# Altium footprint library WR-TBL_Pluggable PCB Header.PcbLib: 719 footprints (part 40 of 45)
Each footprint in its own frame and in the unit in brackets; x right, y up, seen from the top. Pads: shape width x height; smd on the part's side, far side on the other; paste and mask are expansions set on the pad; w line width, h text height; cw(c..) or ccw(c..) is an arc to the next point about the centre after c.
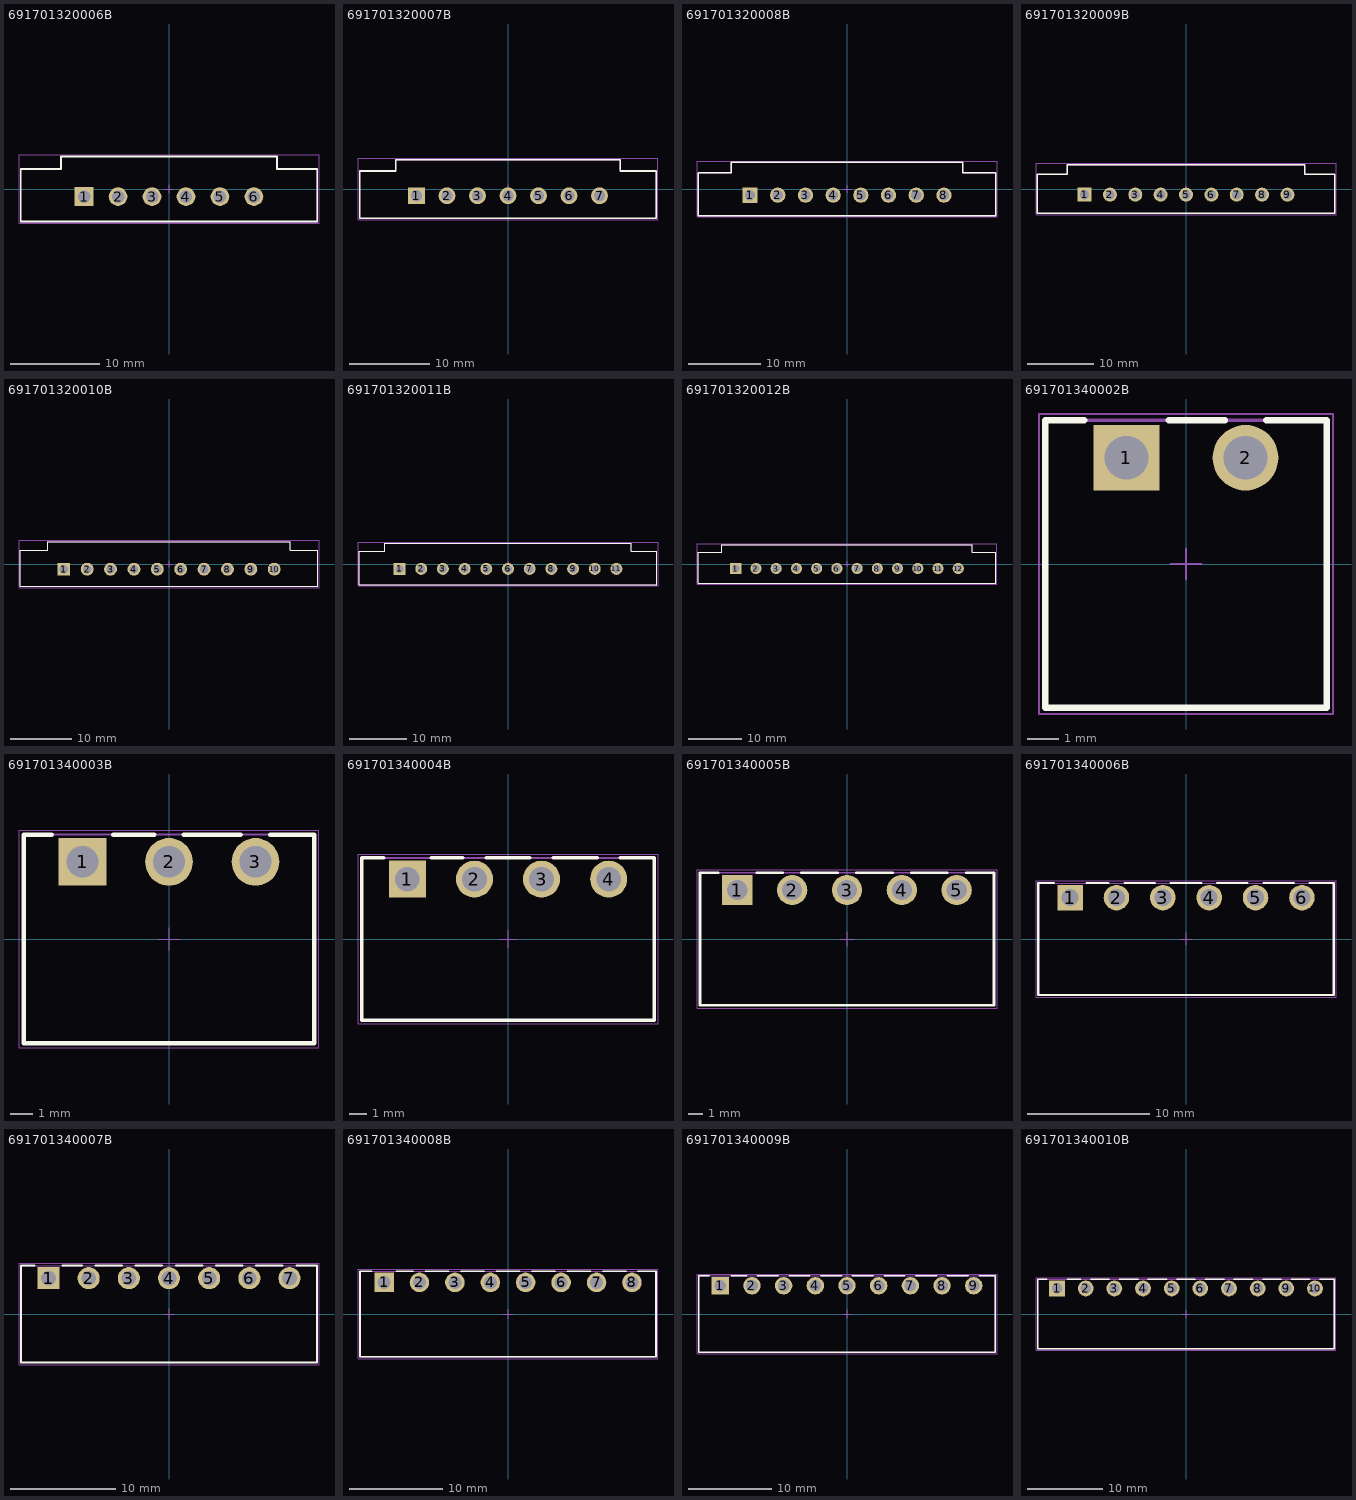
[diagram p39: the footprints below, top view; thin cyan lines are the x and y axes]

## 691701320006B [mm] "THR - 3,81mm - PCB Vertical Flange - 06p"
height 9.2
pads (6):
  rect 2.1x2.1 hole 1.4: 1(-9.525,-0.85)
  round 2.1 hole 1.4: 2(-5.715,-0.85) 3(-1.905,-0.85) 4(1.905,-0.85) 5(5.715,-0.85) 6(9.525,-0.85)
Top Overlay:
  lines w0.2: -16.625,-3.65 -16.625,2.25 -12.12,2.25 -12.12,3.65 12.12,3.65 12.12,2.25 16.625,2.25 16.625,-3.65 -16.625,-3.65
Mechanical 13:
  lines w0.1: -16.625,-3.65 16.625,-3.65 16.625,2.25 12.12,2.25 12.12,3.65 -12.12,3.65 -12.12,2.25 -16.625,2.25 -16.625,-3.65
Mechanical 15:
  lines w0.05: -0.5,0 0.5,0 ; 0,-0.5 0,0.5 ; -16.825,-3.85 -16.825,3.85 16.825,3.85 16.825,-3.85 -16.825,-3.85
3D body "691701320006B.stp": height 9.25, standoff -2.55, extent -16.625,-3.65 16.625,3.65

## 691701320007B [mm] "THR - 3,81mm - PCB Vertical Flange - 07p"
height 9.2
pads (7):
  rect 2.1x2.1 hole 1.4: 1(-11.43,-0.85)
  round 2.1 hole 1.4: 2(-7.62,-0.85) 3(-3.81,-0.85) 4(0,-0.85) 5(3.81,-0.85) 6(7.62,-0.85) 7(11.43,-0.85)
Top Overlay:
  lines w0.2: -18.53,-3.65 -18.53,2.25 -14.025,2.25 -14.025,3.65 14.025,3.65 14.025,2.25 18.53,2.25 18.53,-3.65 -18.53,-3.65
Mechanical 13:
  lines w0.1: -18.53,-3.65 18.53,-3.65 18.53,2.25 14.025,2.25 14.025,3.65 -14.025,3.65 -14.025,2.25 -18.53,2.25 -18.53,-3.65
Mechanical 15:
  lines w0.05: -0.5,0 0.5,0 ; 0,-0.5 0,0.5 ; -18.73,-3.85 -18.73,3.85 18.73,3.85 18.73,-3.85 -18.73,-3.85
3D body "691701320007B.stp": height 9.25, standoff -2.55, extent -18.53,-3.65 18.53,3.65

## 691701320008B [mm] "THR - 3,81mm - PCB Vertical Flange - 08p"
height 9.2
pads (8):
  rect 2.1x2.1 hole 1.4: 1(-13.335,-0.85)
  round 2.1 hole 1.4: 2(-9.525,-0.85) 3(-5.715,-0.85) 4(-1.905,-0.85) 5(1.905,-0.85) 6(5.715,-0.85) 7(9.525,-0.85) 8(13.335,-0.85)
Top Overlay:
  lines w0.2: -20.435,-3.65 -20.435,2.25 -15.93,2.25 -15.93,3.65 15.93,3.65 15.93,2.25 20.435,2.25 20.435,-3.65 -20.435,-3.65
Mechanical 13:
  lines w0.1: -20.435,-3.65 20.435,-3.65 20.435,2.25 15.93,2.25 15.93,3.65 -15.93,3.65 -15.93,2.25 -20.435,2.25 -20.435,-3.65
Mechanical 15:
  lines w0.05: -0.5,0 0.5,0 ; 0,-0.5 0,0.5 ; -20.635,-3.85 -20.635,3.85 20.635,3.85 20.635,-3.85 -20.635,-3.85
3D body "691701320008B.stp": height 9.25, standoff -2.55, extent -20.435,-3.65 20.435,3.65

## 691701320009B [mm] "THR - 3,81mm - PCB Vertical Flange - 09p"
height 9.2
pads (9):
  rect 2.1x2.1 hole 1.4: 1(-15.24,-0.85)
  round 2.1 hole 1.4: 2(-11.43,-0.85) 3(-7.62,-0.85) 4(-3.81,-0.85) 5(0,-0.85) 6(3.81,-0.85) 7(7.62,-0.85) 8(11.43,-0.85) 9(15.24,-0.85)
Top Overlay:
  lines w0.2: -22.34,-3.65 22.34,-3.65 22.34,2.25 17.835,2.25 17.835,3.65 -17.835,3.65 -17.835,2.25 -22.34,2.25 -22.34,-3.65
Mechanical 13:
  lines w0.1: -22.34,-3.65 -22.34,2.25 -17.835,2.25 -17.835,3.65 17.835,3.65 17.835,2.25 22.34,2.25 22.34,-3.65 -22.34,-3.65
Mechanical 15:
  lines w0.05: -0.5,0 0.5,0 ; 0,-0.5 0,0.5 ; -22.54,-3.85 22.54,-3.85 22.54,3.85 -22.54,3.85 -22.54,-3.85
3D body "691701320009B.stp": height 9.25, standoff -2.55, extent -22.34,-3.65 22.34,3.65

## 691701320010B [mm] "THR - 3,81mm - PCB Vertical Flange - 10p"
height 9.2
pads (10):
  rect 2.1x2.1 hole 1.4: 1(-17.145,-0.85)
  round 2.1 hole 1.4: 2(-13.335,-0.85) 3(-9.525,-0.85) 4(-5.715,-0.85) 5(-1.905,-0.85) 6(1.905,-0.85) 7(5.715,-0.85) 8(9.525,-0.85) 9(13.335,-0.85) 10(17.145,-0.85)
Top Overlay:
  lines w0.2: -24.245,-3.65 24.245,-3.65 24.245,2.25 19.74,2.25 19.74,3.65 -19.74,3.65 -19.74,2.25 -24.245,2.25 -24.245,-3.65
Mechanical 13:
  lines w0.1: -24.245,-3.65 -24.245,2.25 -19.74,2.25 -19.74,3.65 19.74,3.65 19.74,2.25 24.245,2.25 24.245,-3.65 -24.245,-3.65
Mechanical 15:
  lines w0.05: -0.5,0 0.5,0 ; 0,-0.5 0,0.5 ; -24.445,-3.85 24.445,-3.85 24.445,3.85 -24.445,3.85 -24.445,-3.85
3D body "691701320010B.stp": height 9.25, standoff -2.55, extent -24.245,-3.65 24.245,3.65

## 691701320011B [mm] "THR - 3,81mm - PCB Vertical Flange - 11p"
height 9.2
pads (11):
  rect 2.1x2.1 hole 1.4: 1(-19.05,-0.85)
  round 2.1 hole 1.4: 2(-15.24,-0.85) 3(-11.43,-0.85) 4(-7.62,-0.85) 5(-3.81,-0.85) 6(0,-0.85) 7(3.81,-0.85) 8(7.62,-0.85) 9(11.43,-0.85) 10(15.24,-0.85) 11(19.05,-0.85)
Top Overlay:
  lines w0.2: -26.15,-3.65 -26.15,2.25 -21.645,2.25 -21.645,3.65 21.645,3.65 21.645,2.25 26.15,2.25 26.15,-3.65 -26.15,-3.65
Mechanical 13:
  lines w0.1: -26.15,-3.65 26.15,-3.65 26.15,2.25 21.645,2.25 21.645,3.65 -21.645,3.65 -21.645,2.25 -26.15,2.25 -26.15,-3.65
Mechanical 15:
  lines w0.05: -0.5,0 0.5,0 ; 0,-0.5 0,0.5 ; -26.35,-3.85 -26.35,3.85 26.35,3.85 26.35,-3.85 -26.35,-3.85
3D body "691701320011B.stp": height 9.25, standoff -2.55, extent -26.15,-3.65 26.15,3.65

## 691701320012B [mm] "THR - 3,81mm - PCB Vertical Flange - 12p"
height 9.2
pads (12):
  rect 2.1x2.1 hole 1.4: 1(-20.955,-0.85)
  round 2.1 hole 1.4: 2(-17.145,-0.85) 3(-13.335,-0.85) 4(-9.525,-0.85) 5(-5.715,-0.85) 6(-1.905,-0.85) 7(1.905,-0.85) 8(5.715,-0.85) 9(9.525,-0.85) 10(13.335,-0.85) 11(17.145,-0.85) 12(20.955,-0.85)
Top Overlay:
  lines w0.2: -28.055,-3.65 -28.055,2.25 -23.55,2.25 -23.55,3.65 23.55,3.65 23.55,2.25 28.055,2.25 28.055,-3.65 -28.055,-3.65
Mechanical 13:
  lines w0.1: -28.055,-3.65 28.055,-3.65 28.055,2.25 23.55,2.25 23.55,3.65 -23.55,3.65 -23.55,2.25 -28.055,2.25 -28.055,-3.65
Mechanical 15:
  lines w0.05: -0.5,0 0.5,0 ; 0,-0.5 0,0.5 ; -28.255,-3.85 -28.255,3.85 28.255,3.85 28.255,-3.85 -28.255,-3.85
3D body "691701320012B.stp": height 9.25, standoff -2.55, extent -28.055,-3.65 28.055,3.65

## 691701340002B [mm] "Horizontal PCB Header THR Type, pitch 3.81mm, 02p"
height 7.3
pads (2):
  rect 2.1x2.1 hole 1.4: 1(-1.905,3.4)
  round 2.1 hole 1.4: 2(1.905,3.4)
Top Overlay:
  lines w0.2: -3.255,4.6 -4.505,4.6 -4.505,-4.6 4.505,-4.6 4.505,4.6 2.565,4.6 ; -0.555,4.6 1.245,4.6
Mechanical 13:
  lines w0.1: -4.505,-4.6 4.505,-4.6 4.505,4.6 -4.505,4.6 -4.505,-4.6
Mechanical 15:
  lines w0.05: -0.5,0 0.5,0 ; 0,-0.5 0,0.5 ; -4.705,-4.8 -4.705,4.8 4.705,4.8 4.705,-4.8 -4.705,-4.8
3D body "691701340002B.stp": height 7.4, standoff -2.5, extent -4.505,-4.6 4.505,4.6

## 691701340003B [mm] "Horizontal PCB Header THR Type, pitch 3.81mm, 03p"
height 7.3
pads (3):
  rect 2.1x2.1 hole 1.4: 1(-3.81,3.4)
  round 2.1 hole 1.4: 2(0,3.4) 3(3.81,3.4)
Top Overlay:
  lines w0.2: -5.16,4.6 -6.41,4.6 -6.41,-4.6 6.41,-4.6 6.41,4.6 4.47,4.6 ; -2.46,4.6 -0.66,4.6 ; 0.66,4.6 3.15,4.6
Mechanical 13:
  lines w0.1: -6.41,-4.6 6.41,-4.6 6.41,4.6 -6.41,4.6 -6.41,-4.6
Mechanical 15:
  lines w0.05: -0.5,0 0.5,0 ; 0,-0.5 0,0.5 ; -6.61,-4.8 -6.61,4.8 6.61,4.8 6.61,-4.8 -6.61,-4.8
3D body "691701340003B.stp": height 7.4, standoff -2.5, extent -6.41,-4.6 6.41,4.6

## 691701340004B [mm] "Horizontal PCB Header THR Type, pitch 3.81mm, 04p"
height 7.3
pads (4):
  rect 2.1x2.1 hole 1.4: 1(-5.715,3.4)
  round 2.1 hole 1.4: 2(-1.905,3.4) 3(1.905,3.4) 4(5.715,3.4)
Top Overlay:
  lines w0.2: -7.065,4.6 -8.315,4.6 -8.315,-4.6 8.315,-4.6 8.315,4.6 6.375,4.6 ; -4.365,4.6 -2.565,4.6 ; -1.245,4.6 1.245,4.6 ; 2.565,4.6 5.055,4.6
Mechanical 13:
  lines w0.1: -8.315,-4.6 -8.315,4.6 8.315,4.6 8.315,-4.6 -8.315,-4.6
Mechanical 15:
  lines w0.05: -0.5,0 0.5,0 ; 0,-0.5 0,0.5 ; -8.515,-4.8 8.515,-4.8 8.515,4.8 -8.515,4.8 -8.515,-4.8
3D body "691701340004B.stp": height 7.4, standoff -2.5, extent -8.315,-4.6 8.315,4.6

## 691701340005B [mm] "Horizontal PCB Header THR Type, pitch 3.81mm, 05p"
height 7.3
pads (5):
  rect 2.1x2.1 hole 1.4: 1(-7.62,3.4)
  round 2.1 hole 1.4: 2(-3.81,3.4) 3(0,3.4) 4(3.81,3.4) 5(7.62,3.4)
Top Overlay:
  lines w0.2: -8.97,4.6 -10.22,4.6 -10.22,-4.6 10.22,-4.6 10.22,4.6 8.28,4.6 ; -6.27,4.6 -4.47,4.6 ; -3.15,4.6 -0.66,4.6 ; 0.66,4.6 3.15,4.6 ; 4.47,4.6 6.96,4.6
Mechanical 13:
  lines w0.1: -10.22,-4.6 10.22,-4.6 10.22,4.6 -10.22,4.6 -10.22,-4.6
Mechanical 15:
  lines w0.05: -0.5,0 0.5,0 ; 0,-0.5 0,0.5 ; -10.42,-4.8 -10.42,4.8 10.42,4.8 10.42,-4.8 -10.42,-4.8
3D body "691701340005B.stp": height 7.4, standoff -2.5, extent -10.22,-4.6 10.22,4.6

## 691701340006B [mm] "Horizontal PCB Header THR Type, pitch 3.81mm, 06p"
height 7.3
pads (6):
  rect 2.1x2.1 hole 1.4: 1(-9.525,3.4)
  round 2.1 hole 1.4: 2(-5.715,3.4) 3(-1.905,3.4) 4(1.905,3.4) 5(5.715,3.4) 6(9.525,3.4)
Top Overlay:
  lines w0.2: -10.875,4.6 -12.125,4.6 -12.125,-4.6 12.125,-4.6 12.125,4.6 10.185,4.6 ; -8.175,4.6 -6.375,4.6 ; -5.055,4.6 -2.565,4.6 ; -1.245,4.6 1.245,4.6 ; 2.565,4.6 5.055,4.6 ; 6.375,4.6 8.865,4.6
Mechanical 13:
  lines w0.1: -12.125,-4.6 12.125,-4.6 12.125,4.6 -12.125,4.6 -12.125,-4.6
Mechanical 15:
  lines w0.05: -0.5,0 0.5,0 ; 0,-0.5 0,0.5 ; -12.325,-4.8 -12.325,4.8 12.325,4.8 12.325,-4.8 -12.325,-4.8
3D body "691701340006B.stp": height 7.4, standoff -2.5, extent -12.125,-4.6 12.125,4.6

## 691701340007B [mm] "Horizontal PCB Header THR Type, pitch 3.81mm, 07p"
height 7.3
pads (7):
  rect 2.1x2.1 hole 1.4: 1(-11.43,3.4)
  round 2.1 hole 1.4: 2(-7.62,3.4) 3(-3.81,3.4) 4(0,3.4) 5(3.81,3.4) 6(7.62,3.4) 7(11.43,3.4)
Top Overlay:
  lines w0.2: -12.78,4.6 -14.03,4.6 -14.03,-4.6 14.03,-4.6 14.03,4.6 12.09,4.6 ; -10.08,4.6 -8.28,4.6 ; -6.96,4.6 -4.47,4.6 ; -3.15,4.6 -0.66,4.6 ; 0.66,4.6 3.15,4.6 ; 4.47,4.6 6.96,4.6 ; 8.28,4.6 10.77,4.6
Mechanical 13:
  lines w0.1: -14.03,-4.6 -14.03,4.6 14.03,4.6 14.03,-4.6 -14.03,-4.6
Mechanical 15:
  lines w0.05: -0.5,0 0.5,0 ; 0,-0.5 0,0.5 ; -14.23,-4.8 14.23,-4.8 14.23,4.8 -14.23,4.8 -14.23,-4.8
3D body "691701340007B.stp": height 7.4, standoff -2.5, extent -14.03,-4.6 14.03,4.6

## 691701340008B [mm] "Horizontal PCB Header THR Type, pitch 3.81mm, 08p"
height 7.3
pads (8):
  rect 2.1x2.1 hole 1.4: 1(-13.335,3.4)
  round 2.1 hole 1.4: 2(-9.525,3.4) 3(-5.715,3.4) 4(-1.905,3.4) 5(1.905,3.4) 6(5.715,3.4) 7(9.525,3.4) 8(13.335,3.4)
Top Overlay:
  lines w0.2: -14.685,4.6 -15.935,4.6 -15.935,-4.6 15.935,-4.6 15.935,4.6 13.995,4.6 ; -11.985,4.6 -10.185,4.6 ; -8.865,4.6 -6.375,4.6 ; -5.055,4.6 -2.565,4.6 ; -1.245,4.6 1.245,4.6 ; 2.565,4.6 5.055,4.6 ; 6.375,4.6 8.865,4.6 ; 10.185,4.6 12.675,4.6
Mechanical 13:
  lines w0.1: -15.935,-4.6 -15.935,4.6 15.935,4.6 15.935,-4.6 -15.935,-4.6
Mechanical 15:
  lines w0.05: -0.5,0 0.5,0 ; 0,-0.5 0,0.5 ; -16.135,-4.8 16.135,-4.8 16.135,4.8 -16.135,4.8 -16.135,-4.8
3D body "691701340008B.stp": height 7.4, standoff -2.5, extent -15.935,-4.6 15.935,4.6

## 691701340009B [mm] "Horizontal PCB Header THR Type, pitch 3.81mm, 09p"
height 7.3
pads (9):
  rect 2.1x2.1 hole 1.4: 1(-15.24,3.4)
  round 2.1 hole 1.4: 2(-11.43,3.4) 3(-7.62,3.4) 4(-3.81,3.4) 5(0,3.4) 6(3.81,3.4) 7(7.62,3.4) 8(11.43,3.4) 9(15.24,3.4)
Top Overlay:
  lines w0.2: -16.59,4.6 -17.84,4.6 -17.84,-4.6 17.84,-4.6 17.84,4.6 15.9,4.6 ; -13.89,4.6 -12.09,4.6 ; -10.77,4.6 -8.28,4.6 ; -6.96,4.6 -4.47,4.6 ; -3.15,4.6 -0.66,4.6 ; 0.66,4.6 3.15,4.6 ; 4.47,4.6 6.96,4.6 ; 8.28,4.6 10.77,4.6 ; 12.09,4.6 14.58,4.6
Mechanical 13:
  lines w0.1: -17.84,-4.6 -17.84,4.6 17.84,4.6 17.84,-4.6 -17.84,-4.6
Mechanical 15:
  lines w0.05: -0.5,0 0.5,0 ; 0,-0.5 0,0.5 ; -18.04,-4.8 18.04,-4.8 18.04,4.8 -18.04,4.8 -18.04,-4.8
3D body "691701340009B.stp": height 7.4, standoff -2.5, extent -17.84,-4.6 17.84,4.6

## 691701340010B [mm] "Horizontal PCB Header THR Type, pitch 3.81mm, 10p"
height 7.3
pads (10):
  rect 2.1x2.1 hole 1.4: 1(-17.145,3.4)
  round 2.1 hole 1.4: 2(-13.335,3.4) 3(-9.525,3.4) 4(-5.715,3.4) 5(-1.905,3.4) 6(1.905,3.4) 7(5.715,3.4) 8(9.525,3.4) 9(13.335,3.4) 10(17.145,3.4)
Top Overlay:
  lines w0.2: -18.495,4.6 -19.745,4.6 -19.745,-4.6 19.745,-4.6 19.745,4.6 17.805,4.6 ; -15.795,4.6 -13.995,4.6 ; -12.675,4.6 -10.185,4.6 ; -8.865,4.6 -6.375,4.6 ; -5.055,4.6 -2.565,4.6 ; -1.245,4.6 1.245,4.6 ; 2.565,4.6 5.055,4.6 ; 6.375,4.6 8.865,4.6 ; 10.185,4.6 12.675,4.6 ; 13.995,4.6 16.485,4.6
Mechanical 13:
  lines w0.1: -19.745,-4.6 19.745,-4.6 19.745,4.6 -19.745,4.6 -19.745,-4.6
Mechanical 15:
  lines w0.05: -0.5,0 0.5,0 ; 0,-0.5 0,0.5 ; -19.945,-4.8 -19.945,4.8 19.945,4.8 19.945,-4.8 -19.945,-4.8
3D body "691701340010B.stp": height 7.4, standoff -2.5, extent -19.745,-4.6 19.745,4.6